# Altium footprint library WR-TBL_Pluggable PCB Header.PcbLib: 719 footprints (part 16 of 45)
Each footprint in its own frame and in the unit in brackets; x right, y up, seen from the top. Pads: shape width x height; smd on the part's side, far side on the other; paste and mask are expansions set on the pad; w line width, h text height; cw(c..) or ccw(c..) is an arc to the next point about the centre after c.
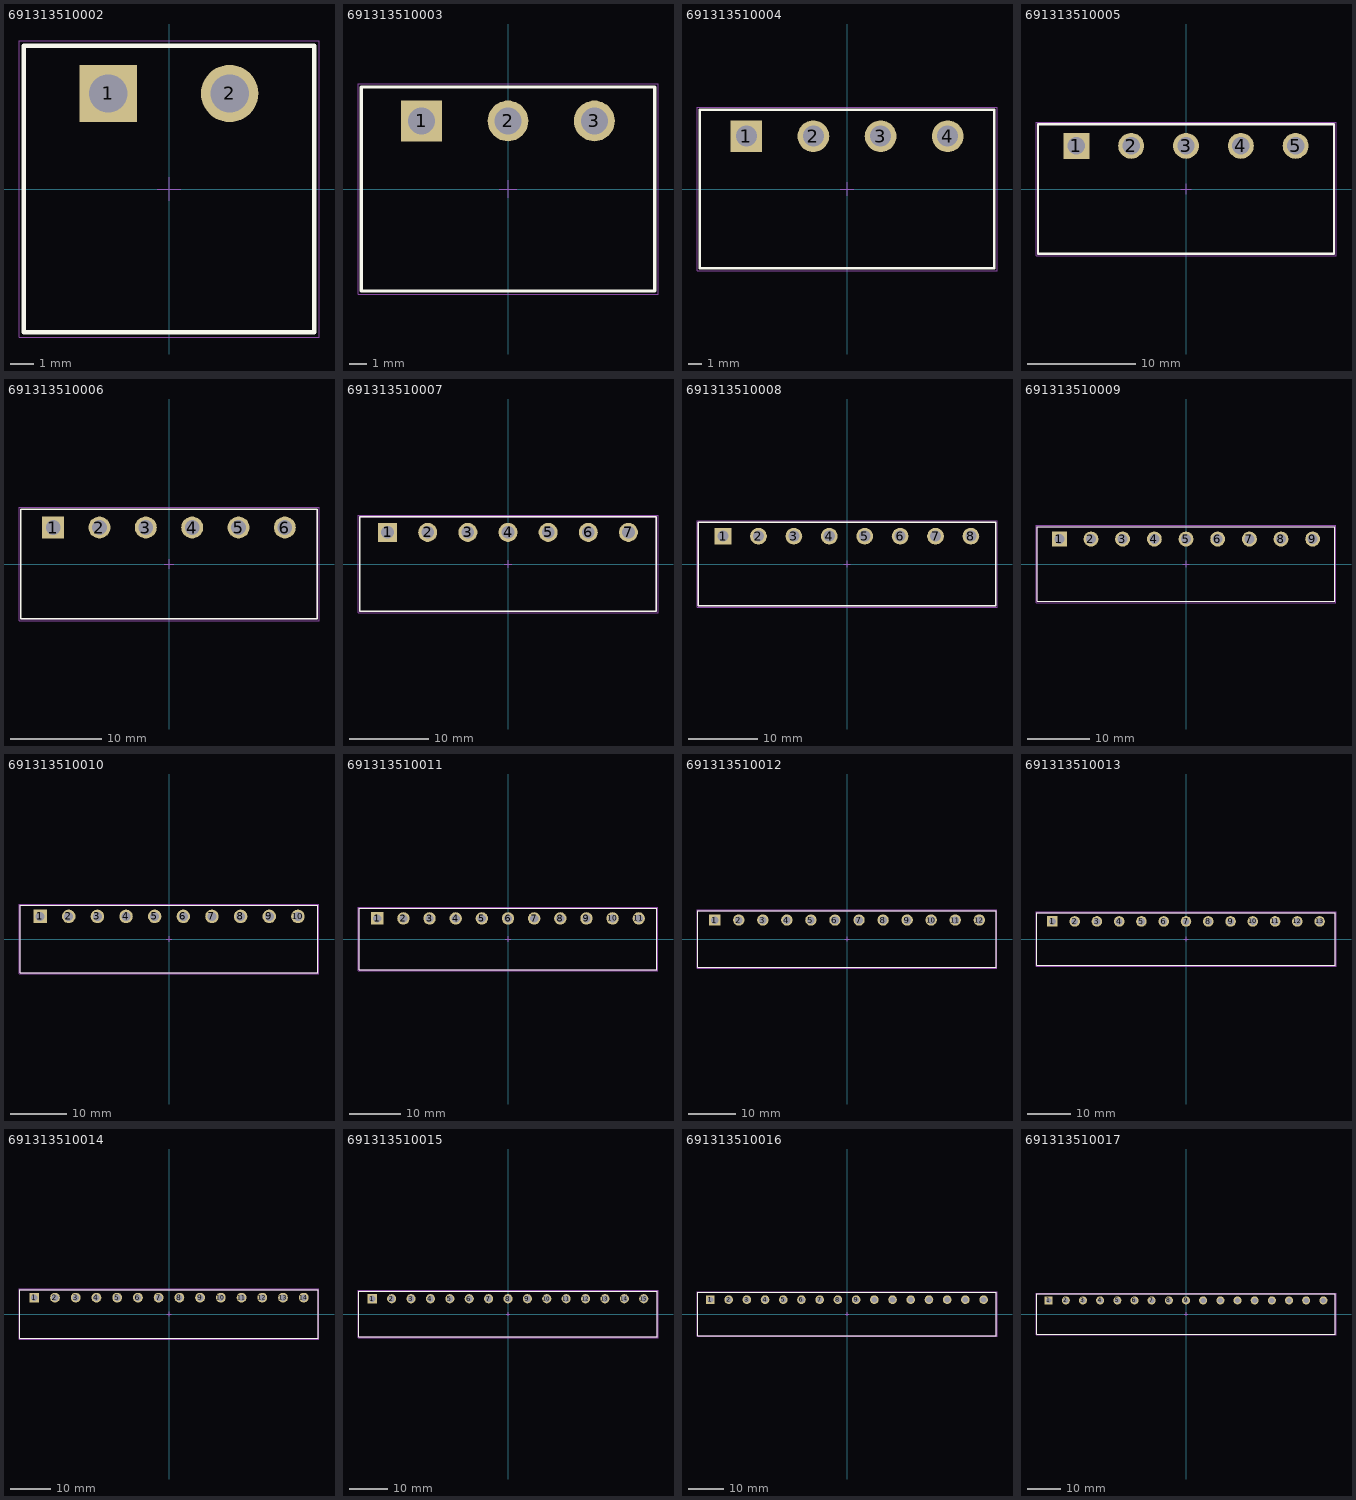
[diagram p15: the footprints below, top view; thin cyan lines are the x and y axes]

## 691313510002 [mm] "5,08mm - PCB Headers - Horizontal - Closed ends - 02p"
height 8.5
pads (2):
  rect 2.4x2.4 hole 1.6: 1(-2.54,4)
  round 2.4 hole 1.6: 2(2.54,4)
Top Overlay:
  lines w0.2: -6.08,-6 -6.08,6 6.08,6 6.08,-6 -6.08,-6
Mechanical 13:
  lines w0.1: -6.08,-6 6.08,-6 6.08,6 -6.08,6 -6.08,-6
Mechanical 15:
  lines w0.05: -0.5,0 0.5,0 ; 0,-0.5 0,0.5 ; -6.28,-6.2 -6.28,6.2 6.28,6.2 6.28,-6.2 -6.28,-6.2
3D body "691313510002.stp": height 8.55, standoff -3.45, extent -6.08,-6 6.08,6

## 691313510003 [mm] "5,08mm - PCB Headers - Horizontal - Closed ends - 03p"
height 8.5
pads (3):
  rect 2.4x2.4 hole 1.6: 1(-5.08,4)
  round 2.4 hole 1.6: 2(0,4) 3(5.08,4)
Top Overlay:
  lines w0.2: -8.62,-6 -8.62,6 8.62,6 8.62,-6 -8.62,-6
Mechanical 13:
  lines w0.1: -8.62,-6 8.62,-6 8.62,6 -8.62,6 -8.62,-6
Mechanical 15:
  lines w0.05: -0.5,0 0.5,0 ; 0,-0.5 0,0.5 ; -8.82,-6.2 -8.82,6.2 8.82,6.2 8.82,-6.2 -8.82,-6.2
3D body "691313510003.stp": height 8.55, standoff -3.45, extent -8.62,-6 8.62,6

## 691313510004 [mm] "5,08mm - PCB Headers - Horizontal - Closed ends - 04p"
height 8.5
pads (4):
  rect 2.4x2.4 hole 1.6: 1(-7.62,4)
  round 2.4 hole 1.6: 2(-2.54,4) 3(2.54,4) 4(7.62,4)
Top Overlay:
  lines w0.2: -11.16,-6 11.16,-6 11.16,6 -11.16,6 -11.16,-6
Mechanical 13:
  lines w0.1: -11.16,-6 -11.16,6 11.16,6 11.16,-6 -11.16,-6
Mechanical 15:
  lines w0.05: -0.5,0 0.5,0 ; 0,-0.5 0,0.5 ; -11.36,-6.2 11.36,-6.2 11.36,6.2 -11.36,6.2 -11.36,-6.2
3D body "691313510004.stp": height 8.55, standoff -3.45, extent -11.16,-6 11.16,6

## 691313510005 [mm] "5,08mm - PCB Headers - Horizontal - Closed ends - 05p"
height 8.5
pads (5):
  rect 2.4x2.4 hole 1.6: 1(-10.16,4)
  round 2.4 hole 1.6: 2(-5.08,4) 3(0,4) 4(5.08,4) 5(10.16,4)
Top Overlay:
  lines w0.2: -13.7,-6 -13.7,6 13.7,6 13.7,-6 -13.7,-6
Mechanical 13:
  lines w0.1: -13.7,-6 13.7,-6 13.7,6 -13.7,6 -13.7,-6
Mechanical 15:
  lines w0.05: -0.5,0 0.5,0 ; 0,-0.5 0,0.5 ; -13.9,-6.2 -13.9,6.2 13.9,6.2 13.9,-6.2 -13.9,-6.2
3D body "691313510005.stp": height 8.55, standoff -3.45, extent -13.7,-6 13.7,6

## 691313510006 [mm] "5,08mm - PCB Headers - Horizontal - Closed ends - 06p"
height 8.5
pads (6):
  rect 2.4x2.4 hole 1.6: 1(-12.7,4)
  round 2.4 hole 1.6: 2(-7.62,4) 3(-2.54,4) 4(2.54,4) 5(7.62,4) 6(12.7,4)
Top Overlay:
  lines w0.2: -16.24,-6 -16.24,6 16.24,6 16.24,-6 -16.24,-6
Mechanical 13:
  lines w0.1: -16.24,-6 16.24,-6 16.24,6 -16.24,6 -16.24,-6
Mechanical 15:
  lines w0.05: -0.5,0 0.5,0 ; 0,-0.5 0,0.5 ; -16.44,-6.2 -16.44,6.2 16.44,6.2 16.44,-6.2 -16.44,-6.2
3D body "691313510006.stp": height 8.55, standoff -3.45, extent -16.24,-6 16.24,6

## 691313510007 [mm] "5,08mm - PCB Headers - Horizontal - Closed ends - 07p"
height 8.5
pads (7):
  rect 2.4x2.4 hole 1.6: 1(-15.24,4)
  round 2.4 hole 1.6: 2(-10.16,4) 3(-5.08,4) 4(0,4) 5(5.08,4) 6(10.16,4) 7(15.24,4)
Top Overlay:
  lines w0.2: -18.78,-6 -18.78,6 18.78,6 18.78,-6 -18.78,-6
Mechanical 13:
  lines w0.1: -18.78,-6 18.78,-6 18.78,6 -18.78,6 -18.78,-6
Mechanical 15:
  lines w0.05: -0.5,0 0.5,0 ; 0,-0.5 0,0.5 ; -18.98,-6.2 -18.98,6.2 18.98,6.2 18.98,-6.2 -18.98,-6.2
3D body "691313510007.stp": height 8.55, standoff -3.45, extent -18.78,-6 18.78,6

## 691313510008 [mm] "5,08mm - PCB Headers - Horizontal - Closed ends - 08p"
height 8.5
pads (8):
  rect 2.4x2.4 hole 1.6: 1(-17.78,4)
  round 2.4 hole 1.6: 2(-12.7,4) 3(-7.62,4) 4(-2.54,4) 5(2.54,4) 6(7.62,4) 7(12.7,4) 8(17.78,4)
Top Overlay:
  lines w0.2: -21.32,-6 21.32,-6 21.32,6 -21.32,6 -21.32,-6
Mechanical 13:
  lines w0.1: -21.32,-6 -21.32,6 21.32,6 21.32,-6 -21.32,-6
Mechanical 15:
  lines w0.05: -0.5,0 0.5,0 ; 0,-0.5 0,0.5 ; -21.52,-6.2 21.52,-6.2 21.52,6.2 -21.52,6.2 -21.52,-6.2
3D body "691313510008.stp": height 8.55, standoff -3.45, extent -21.32,-6 21.32,6

## 691313510009 [mm] "5,08mm - PCB Headers - Horizontal - Closed ends - 09p"
height 8.5
pads (9):
  rect 2.4x2.4 hole 1.6: 1(-20.32,4)
  round 2.4 hole 1.6: 2(-15.24,4) 3(-10.16,4) 4(-5.08,4) 5(0,4) 6(5.08,4) 7(10.16,4) 8(15.24,4) 9(20.32,4)
Top Overlay:
  lines w0.2: -23.86,-6 -23.86,6 23.86,6 23.86,-6 -23.86,-6
Mechanical 13:
  lines w0.1: -23.86,-6 23.86,-6 23.86,6 -23.86,6 -23.86,-6
Mechanical 15:
  lines w0.05: -0.5,0 0.5,0 ; 0,-0.5 0,0.5 ; -24.06,-6.2 -24.06,6.2 24.06,6.2 24.06,-6.2 -24.06,-6.2
3D body "691313510009.stp": height 8.55, standoff -3.45, extent -23.86,-6 23.86,6

## 691313510010 [mm] "5,08mm - PCB Headers - Horizontal - Closed ends - 10p"
height 8.5
pads (10):
  rect 2.4x2.4 hole 1.6: 1(-22.86,4)
  round 2.4 hole 1.6: 2(-17.78,4) 3(-12.7,4) 4(-7.62,4) 5(-2.54,4) 6(2.54,4) 7(7.62,4) 8(12.7,4) 9(17.78,4) 10(22.86,4)
Top Overlay:
  lines w0.2: -26.4,-6 26.4,-6 26.4,6 -26.4,6 -26.4,-6
Mechanical 13:
  lines w0.1: -26.4,-6 -26.4,6 26.4,6 26.4,-6 -26.4,-6
Mechanical 15:
  lines w0.05: -0.5,0 0.5,0 ; 0,-0.5 0,0.5 ; -26.6,-6.2 26.6,-6.2 26.6,6.2 -26.6,6.2 -26.6,-6.2
3D body "691313510010.stp": height 8.55, standoff -3.45, extent -26.4,-6 26.4,6

## 691313510011 [mm] "5,08mm - PCB Headers - Horizontal - Closed ends - 11p"
height 8.5
pads (11):
  rect 2.4x2.4 hole 1.6: 1(-25.4,4)
  round 2.4 hole 1.6: 2(-20.32,4) 3(-15.24,4) 4(-10.16,4) 5(-5.08,4) 6(0,4) 7(5.08,4) 8(10.16,4) 9(15.24,4) 10(20.32,4) 11(25.4,4)
Top Overlay:
  lines w0.2: -28.94,-6 28.94,-6 28.94,6 -28.94,6 -28.94,-6
Mechanical 13:
  lines w0.1: -28.94,-6 -28.94,6 28.94,6 28.94,-6 -28.94,-6
Mechanical 15:
  lines w0.05: -0.5,0 0.5,0 ; 0,-0.5 0,0.5 ; -29.14,-6.2 29.14,-6.2 29.14,6.2 -29.14,6.2 -29.14,-6.2
3D body "691313510011.stp": height 8.55, standoff -3.45, extent -28.94,-6 28.94,6

## 691313510012 [mm] "5,08mm - PCB Headers - Horizontal - Closed ends - 12p"
height 8.5
pads (12):
  rect 2.4x2.4 hole 1.6: 1(-27.94,4)
  round 2.4 hole 1.6: 2(-22.86,4) 3(-17.78,4) 4(-12.7,4) 5(-7.62,4) 6(-2.54,4) 7(2.54,4) 8(7.62,4) 9(12.7,4) 10(17.78,4) 11(22.86,4) 12(27.94,4)
Top Overlay:
  lines w0.2: -31.48,-6 -31.48,6 31.48,6 31.48,-6 -31.48,-6
Mechanical 13:
  lines w0.1: -31.48,-6 31.48,-6 31.48,6 -31.48,6 -31.48,-6
Mechanical 15:
  lines w0.05: -0.5,0 0.5,0 ; 0,-0.5 0,0.5 ; -31.68,-6.2 -31.68,6.2 31.68,6.2 31.68,-6.2 -31.68,-6.2
3D body "691313510012.stp": height 8.55, standoff -3.45, extent -31.48,-6 31.48,6

## 691313510013 [mm] "5,08mm - PCB Headers - Horizontal - Closed ends - 13p"
height 8.5
pads (13):
  rect 2.4x2.4 hole 1.6: 1(-30.48,4)
  round 2.4 hole 1.6: 2(-25.4,4) 3(-20.32,4) 4(-15.24,4) 5(-10.16,4) 6(-5.08,4) 7(0,4) 8(5.08,4) 9(10.16,4) 10(15.24,4) 11(20.32,4) 12(25.4,4) 13(30.48,4)
Top Overlay:
  lines w0.2: -34.02,-6 34.02,-6 34.02,6 -34.02,6 -34.02,-6
Mechanical 13:
  lines w0.1: -34.02,-6 -34.02,6 34.02,6 34.02,-6 -34.02,-6
Mechanical 15:
  lines w0.05: -0.5,0 0.5,0 ; 0,-0.5 0,0.5 ; -34.22,-6.2 34.22,-6.2 34.22,6.2 -34.22,6.2 -34.22,-6.2
3D body "691313510013.stp": height 8.55, standoff -3.45, extent -34.02,-6 34.02,6

## 691313510014 [mm] "5,08mm - PCB Headers - Horizontal - Closed ends - 14p"
height 8.5
pads (14):
  rect 2.4x2.4 hole 1.6: 1(-33.02,4)
  round 2.4 hole 1.6: 2(-27.94,4) 3(-22.86,4) 4(-17.78,4) 5(-12.7,4) 6(-7.62,4) 7(-2.54,4) 8(2.54,4) 9(7.62,4) 10(12.7,4) 11(17.78,4) 12(22.86,4) 13(27.94,4) 14(33.02,4)
Top Overlay:
  lines w0.2: -36.56,-6 -36.56,6 36.56,6 36.56,-6 -36.56,-6
Mechanical 13:
  lines w0.1: -36.56,-6 36.56,-6 36.56,6 -36.56,6 -36.56,-6
Mechanical 15:
  lines w0.05: -0.5,0 0.5,0 ; 0,-0.5 0,0.5 ; -36.76,-6.2 -36.76,6.2 36.76,6.2 36.76,-6.2 -36.76,-6.2
3D body "691313510014.stp": height 8.55, standoff -3.45, extent -36.56,-6 36.56,6

## 691313510015 [mm] "5,08mm - PCB Headers - Horizontal - Closed ends - 15p"
height 8.5
pads (15):
  rect 2.4x2.4 hole 1.6: 1(-35.56,4)
  round 2.4 hole 1.6: 2(-30.48,4) 3(-25.4,4) 4(-20.32,4) 5(-15.24,4) 6(-10.16,4) 7(-5.08,4) 8(0,4) 9(5.08,4) 10(10.16,4) 11(15.24,4) 12(20.32,4) 13(25.4,4) 14(30.48,4) 15(35.56,4)
Top Overlay:
  lines w0.2: -39.1,-6 -39.1,6 39.1,6 39.1,-6 -39.1,-6
Mechanical 13:
  lines w0.1: -39.1,-6 39.1,-6 39.1,6 -39.1,6 -39.1,-6
Mechanical 15:
  lines w0.05: -0.5,0 0.5,0 ; 0,-0.5 0,0.5 ; -39.3,-6.2 -39.3,6.2 39.3,6.2 39.3,-6.2 -39.3,-6.2
3D body "691313510015.stp": height 8.55, standoff -3.45, extent -39.1,-6 39.1,6

## 691313510016 [mm] "5,08mm - PCB Headers - Horizontal - Closed ends - 16p"
height 8.5
pads (16):
  rect 2.4x2.4 hole 1.6: 1(-38.1,4)
  round 2.4 hole 1.6: 2(-33.02,4) 3(-27.94,4) 4(-22.86,4) 5(-17.78,4) 6(-12.7,4) 7(-7.62,4) 8(-2.54,4) 9(2.54,4) 10(7.62,4) 11(12.7,4) 12(17.78,4) 13(22.86,4) 14(27.94,4) 15(33.02,4) 16(38.1,4)
Top Overlay:
  lines w0.2: -41.64,-6 -41.64,6 41.64,6 41.64,-6 -41.64,-6
Mechanical 13:
  lines w0.1: -41.64,-6 41.64,-6 41.64,6 -41.64,6 -41.64,-6
Mechanical 15:
  lines w0.05: -0.5,0 0.5,0 ; 0,-0.5 0,0.5 ; -41.84,-6.2 -41.84,6.2 41.84,6.2 41.84,-6.2 -41.84,-6.2
3D body "691313510016.stp": height 8.55, standoff -3.45, extent -41.64,-6 41.64,6

## 691313510017 [mm] "5,08mm - PCB Headers - Horizontal - Closed ends - 17p"
height 8.5
pads (17):
  rect 2.4x2.4 hole 1.6: 1(-40.64,4)
  round 2.4 hole 1.6: 2(-35.56,4) 3(-30.48,4) 4(-25.4,4) 5(-20.32,4) 6(-15.24,4) 7(-10.16,4) 8(-5.08,4) 9(0,4) 10(5.08,4) 11(10.16,4) 12(15.24,4) 13(20.32,4) 14(25.4,4) 15(30.48,4) 16(35.56,4) 17(40.64,4)
Top Overlay:
  lines w0.2: -44.18,-6 44.18,-6 44.18,6 -44.18,6 -44.18,-6
Mechanical 13:
  lines w0.1: -44.18,-6 -44.18,6 44.18,6 44.18,-6 -44.18,-6
Mechanical 15:
  lines w0.05: -0.5,0 0.5,0 ; 0,-0.5 0,0.5 ; -44.38,-6.2 44.38,-6.2 44.38,6.2 -44.38,6.2 -44.38,-6.2
3D body "691313510017.stp": height 8.55, standoff -3.45, extent -44.18,-6 44.18,6